# Altium footprint library CUSTOM PCB.PcbLib: 404 footprints (part 24 of 26)
Each footprint in its own frame and in the unit in brackets; x right, y up, seen from the top. Pads: shape width x height; smd on the part's side, far side on the other; paste and mask are expansions set on the pad; w line width, h text height; cw(c..) or ccw(c..) is an arc to the next point about the centre after c.
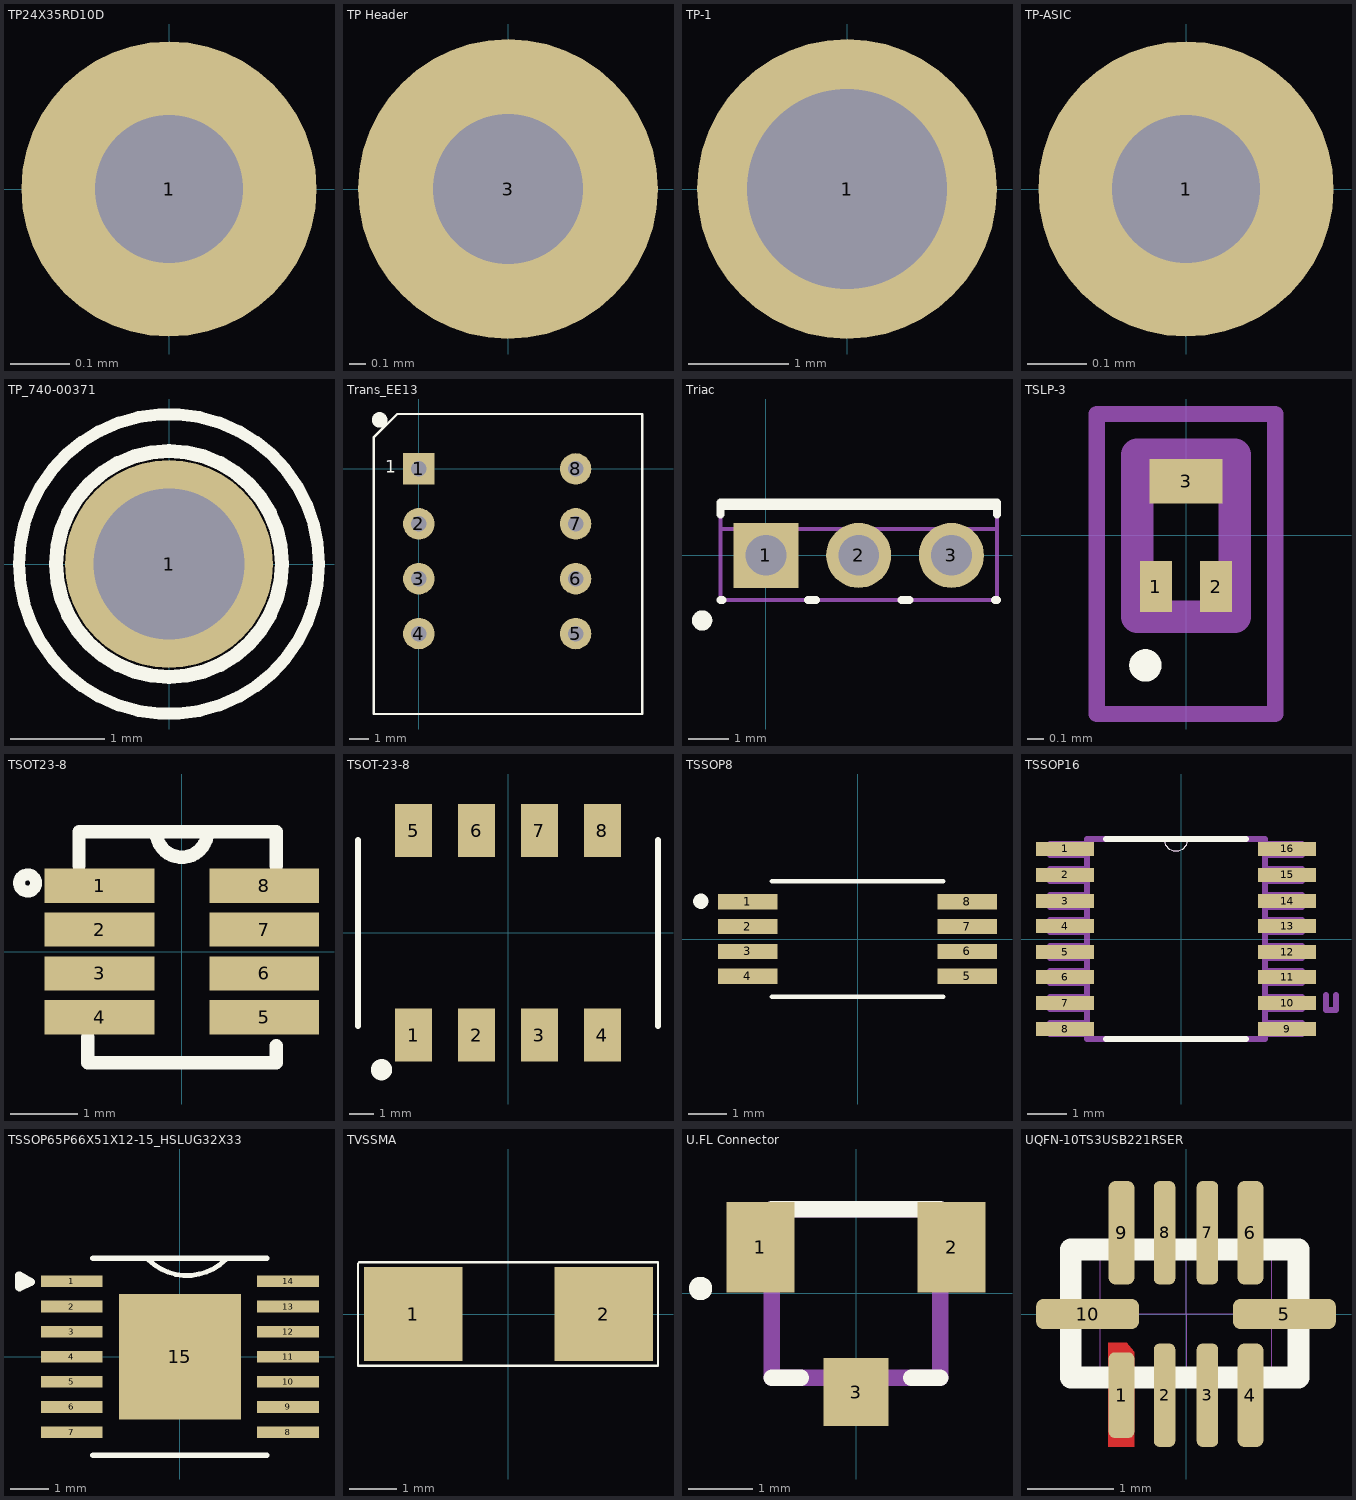
[diagram p23: the footprints below, top view; thin cyan lines are the x and y axes]

## TP24X35RD10D [mm]
pads (1):
  round 0.5 / inner round 0.5 / far side round 1 hole 0.25: 1(0,0)

## TP Header [mm]
pads (1):
  round 1.8 hole 0.9: 3(0,0)

## TP-1 [mm] "Tp"
pads (1):
  round 3 hole 2: 1(0,0)

## TP-ASIC [mm]
pads (1):
  round 0.5 / inner round 0.5 / far side round 1 hole 0.25: 1(0,0)

## TP_740-00371 [mm]
pads (1):
  round 2.2 hole 1.6: 1(0,0)
Top Overlay:
  circle w0.127: c0,0 r1.585
  circle w0.15: c0,0 r1.194

## Trans_EE13 [mil]
pads (8):
  rect 63x63 hole 31.5: 1(0,0)
  round 63 hole 31.5: 2(0,-110.24) 3(0,-220.47) 4(0,-330.71) 5(314.96,-330.71) 6(314.96,-220.47) 7(314.96,-110.24) 8(314.96,0)
Top Overlay:
  circle w20: c-78.74,98.43 r5.57
  lines w5: -90.55,-492.13 -90.55,62.99 -43.31,110.24 448.82,110.24 448.82,-492.13 -90.55,-492.13
  text "1" at -66.93,-7.87 h25
3D body: height 600, standoff 10, extent -90.55,-489.76 449.45,110.24

## Triac [mm]
pads (3):
  rect 1.6x1.6 hole 1: 1(0,0)
  round 1.6 hole 1: 2(2.28,0) 3(4.56,0)
Top Overlay:
  circle w0.25: c-1.57,-1.6 r0.125
  lines w0.2: -1.12,-1.1 -1.07,-1.1 ; -1.12,1 -1.12,1.3 5.68,1.3 5.68,1 ; -1.12,1.21 5.68,1.21 ; 1.03,-1.1 1.23,-1.1 ; 3.33,-1.1 3.53,-1.1 ; 5.63,-1.1 5.68,-1.1
Mechanical 13:
  lines w0.1: -1.12,0.65 5.68,0.65 ; -1.12,-1.1 -1.12,1.3 5.68,1.3 5.68,-1.1 -1.12,-1.1
Mechanical 15:
  lines w0.1: 1.78,0 2.78,0 ; 2.28,-0.5 2.28,0.5
3D body: height 9.7, standoff 9.3, extent -1.119,0.651 5.679,1.299
3D body: height 9.3, standoff 2.6, extent -1.17,-1.15 5.73,1.35

## TSLP-3 [mm] "TSLP-3 ESD"
pads (3):
  rect 0.2x0.315 smd: 1(-0.185,-0.318) 2(0.185,-0.318)
  rect 0.45x0.275 smd: 3(0,0.332)
Top Overlay:
  lines w0.1: -0.3,-0.803 cw(c-0.25,-0.803) -0.2,-0.803 cw(c-0.25,-0.803) -0.3,-0.803
Mechanical 15:
  lines w0.2: -0.3,-0.503 0.3,-0.503 0.3,0.497 -0.3,0.497 -0.3,-0.503
Mechanical 20:
  lines w0.1: -0.55,-1.103 0.55,-1.103 0.55,0.747 -0.55,0.747 -0.55,-1.103
3D body "User Library-PG-TSLP-3.STEP": height 0.37, standoff -0.08, extent -0.3,-0.5 0.3,0.5

## TSOT23-8 [mil]
pads (8):
  rect 64x20 smd paste+0 mask+0: 1(-48,38.39) 2(-48,12.8) 3(-48,-12.8) 4(-48,-38.39) 5(48,-38.39) 6(48,-12.8) 7(48,12.8) 8(48,38.39)
Top Overlay:
  circle w7: c-90,40 r5
  lines w7.87: -60,50 -60,70 55,70 55,50 ; -55,-50 -55,-65 55,-65 55,-55 ; -15,70 ccw(c0,70) 15,70
3D body "DDF0008A-M.step": height 43.11, standoff 0, extent -57.99,-57.99 57.99,57.99

## TSOT-23-8 [mm]
pads (8):
  rect 1.5x2.15 smd: 1(-3.81,-4.125) 2(-1.27,-4.125) 3(1.27,-4.125) 4(3.81,-4.125) 5(-3.81,4.125) 6(-1.27,4.125) 7(1.27,4.125) 8(3.81,4.125)
Top Overlay:
  circle w0.5: c-5.101,-5.52 r0.178
  lines w0.254: -6.05,-3.745 -6.05,3.745 ; 6.05,-3.745 6.05,3.745
3D body "SDA04H1SBD.stp": height 5.49, standoff -0.01, extent -6.045,-4.65 6.045,4.65

## TSSOP8 [mm]
pads (8):
  rect 1.56x0.4 smd: 1(-2.88,0.975) 2(-2.88,0.325) 3(-2.88,-0.325) 4(-2.88,-0.975) 5(2.88,-0.975) 6(2.88,-0.325) 7(2.88,0.325) 8(2.88,0.975)
Top Overlay:
  circle w0.2: c-4.115,0.991 r0.1
  lines w0.127: -2.25,-1.515 2.25,-1.515 ; -2.25,1.515 2.25,1.515
3D body "tssop8_model.STEP": height 1.08, standoff -0.02, extent -3.2,-1.476 3.2,1.524

## TSSOP16 [mil]
pads (16):
  rect 58x14 smd: 1(-116,90) 2(-116,64) 3(-116,38) 4(-116,13) 5(-116,-13) 6(-116,-38) 7(-116,-64) 8(-116,-90) 9(106,-90) 10(106,-64) 11(106,-38) 12(106,-13) 13(106,13) 14(106,38) 15(106,64) 16(106,90)
Top Overlay:
  lines w0: -17,100 ccw(c-5,100) 7,100
  lines w6: -75,-100 65,-100 ; -75,100 -17,100 7,100 65,100
Mechanical 1:
  lines w0: -17,100 ccw(c-5,100) 7,100
  lines w6: 145,-56 145,-71 155,-71 155,-56 ; -131,-95 -94,-95 -94,-84 -131,-84 -131,-95 ; -131,-70 -94,-70 -94,-58 -131,-58 -131,-70 ; -131,-44 -94,-44 -94,-32 -131,-32 -131,-44 ; -131,-19 -94,-19 -94,-7 -131,-7 -131,-19 ; -131,7 -94,7 -94,19 -131,19 -131,7 ; -131,32 -94,32 -94,44 -131,44 -131,32 ; -131,58 -94,58 -94,70 -131,70 -131,58 ; -131,84 -94,84 -94,95 -131,95 -131,84 ; -94,-100 -94,100 -17,100 7,100 84,100 84,-100 -94,-100 ; 84,-95 121,-95 121,-84 84,-84 84,-95 ; 84,-70 121,-70 121,-58 84,-58 84,-70 ; 84,-44 121,-44 121,-32 84,-32 84,-44 ; 84,-19 121,-19 121,-7 84,-7 84,-19 ; 84,7 121,7 121,19 84,19 84,7 ; 84,32 121,32 121,44 84,44 84,32 ; 84,58 121,58 121,70 84,70 84,58 ; 84,84 121,84 121,95 84,95 84,84
  text "*" at -149.35,88.4 h73.82
  text "*" at -149.47,88.48 h73.82
3D body "User Library-TSSOP-16 5_1x4_4.STEP": height 19.68, standoff -23.62, extent -125.98,-100.38 125.99,100.4

## TSSOP65P66X51X12-15_HSLUG32X33 [mm]
pads (15):
  rect 1.6x0.3 smd: 1(-2.8,1.95) 2(-2.8,1.3) 3(-2.8,0.65) 4(-2.8,0) 5(-2.8,-0.65) 6(-2.8,-1.3) 7(-2.8,-1.95) 8(2.8,-1.95) 9(2.8,-1.3) 10(2.8,-0.65) 11(2.8,0) 12(2.8,0.65) 13(2.8,1.3) 14(2.8,1.95)
  rect 3.15x3.25 smd: 15(0,0)
Top Overlay:
  lines w0.127: -0.821,2.513 ccw(c0.182,3.533) 1.202,2.53
  lines w0.15: -2.25,-2.55 2.25,-2.55 ; -2.25,2.55 2.25,2.55
  lines w0.2: -4.165,1.799 -4.165,2.113 -3.855,1.936 -4.152,1.792
3D body "User Library-tssop14-2.x_t": height 1.1, standoff -0.1, extent -3.2,-2.55 3.2,2.55

## TVSSMA [mm]
pads (2):
  rect 2.1x2 smd: 1(-2.032,0) 2(2.032,0)
Top Overlay:
  lines w0.05: -3.205,1.076 -3.205,-1.102 3.184,-1.102 3.184,1.102 -3.183,1.102
3D body "SMASeries-M.step": height 2.34, standoff 0, extent -2.642,-1.397 2.642,1.397

## U.FL Connector [mm] "Antenna 2.4 Ghz Female connector"
pads (3):
  rect 1.05x1.4 smd: 1(-1.475,0.711) 2(1.475,0.711)
  rect 1x1.05 smd: 3(0,-1.525)
Top Overlay:
  circle w0.254: c-2.401,0.074 r0.054
  lines w0.254: -1.3,-1.3 -0.85,-1.3 ; -1.3,1.3 1.3,1.3 ; 0.85,-1.3 1.3,-1.3
Mechanical 15:
  lines w0.254: -1.3,-1.3 1.3,-1.3 1.3,1.3 -1.3,1.3 -1.3,-1.3
3D body "u.Fl Antenna Connector - 523-A-1JB.SLDPRT": height 1.25, standoff 0, extent -1.499,-1.829 1.501,1.271

## UQFN-10TS3USB221RSER [mm]
pads (10):
  rrect50% 0.3x1 smd: 1(-0.75,-0.945)
  rrect50% 0.25x1.2 smd: 2(-0.25,-0.945) 3(0.25,-0.945) 7(0.25,0.945) 8(-0.25,0.945)
  rrect50% 0.3x1.2 smd: 4(0.75,-0.945) 6(0.75,0.945) 9(-0.75,0.945)
  rrect50% 1.2x0.35 smd: 5(1.145,0) 10(-1.145,0)
Top Layer:
  region: -0.69,-0.336 -0.6,-0.441 -0.6,-1.545 -0.903,-1.545 -0.903,-0.336
Top Overlay:
  lines w0.254: -1,0.75 -0.899,0.75 ; -0.899,0.75 1.31,0.75 1.31,-0.74 -1.34,-0.74 -1.34,0.75 -0.899,0.75
Mechanical 15:
  lines w0.003: 0,-0.75 0,0 ; 0,0.75 0,0 ; -1,0 -1,0.75 1,0.75 1,0 ; -1,0 -1,-0.75 1,-0.75 1,0 ; -1,0 1,0 ; 0,0 1,0
3D body "User Library-X2QFN-10.step": height 0.4, standoff 0, extent -1,-0.75 1,0.75